# Altium integrated library MS-Electronic.IntLib: 363 symbols (part 2 of 2) (continued)
## Res_1K5_1206_1%_1/4W (continued)
RES 1.5K OHM 1% 1/4W 1206; ComponentLink2Description: CXT; ComponentLink2URL: https://linhkien.cxtvn.com/3351-dien-tro-1206-5-thong-so-tu-1k-den-91k.html; ComponentLink3Description: DIGIKEY; ComponentLink3URL: https://www.digikey.bg/en/products/detail/te-connectivity-passive-product/CRGCQ1206F1K5/8576414
footprint Res_1206
pins: 1, 2

## Res_1K_0402_1%_1/16W
designator R?, comment value 1K  Power: 1/16W  Tolerance: 1%  Pakage: 0402  (hidden comment: RC0402FR-071KL)
RES 1K OHM 1% 1/16W 0402; ComponentLink1Description: CXT; ComponentLink1URL: https://linhkien.cxtvn.com/3454-dien-tro-0402-1-thong-so-tu-1k-den-91k.html; ComponentLink2Description: DIGIKEY; ComponentLink2URL: https://www.digikey.bg/en/products/detail/yageo/RC0402FR-071KL/726513?s=N4IgTCBcDaIEoGEAMAWJYBicC0SDsAjANIAyIAugL5A
footprint RES_0402
pins: 1, 2

## Res_1K_0603_0.01%_1/10W
designator R?, comment value 1K  Power: 1/10W  Pakage: 0603  Tolerance: 0.01%  (hidden comment: RNCF0603TKY1K00)
RES SMD 1K OHM 0.01% 1/10W 0603; ComponentLink1Description: DIGIKEY; ComponentLink1URL: https://www.digikey.bg/en/products/detail/stackpole-electronics-inc/RNCF0603TKY1K00/2269697?s=N4IgTCBcDaIEoDkDCAxADANjQZgCoGkBNARnzTRAF0BfIA
footprint RESC1608X05N (Chip Resistor, 2-Leads, Body 1.60x0.80mm (0603))
pins: 1, 2

## Res_1K_0603_1%_1/10W
designator R?, comment value 1K  Power: 1/10W  Pakage: 0603  Tolerance: 1%  (hidden comment: RC0603FR-071KL)
RES 1K OHM 1% 1/10W 0603; ComponentLink1Description: New link; ComponentLink1URL: https://linhkien.cxtvn.com/1424-dien-tro-0603-1-thong-so-tu-1k-den-91k.html; ComponentLink2Description: New link 1; ComponentLink2URL: https://www.digikey.bg/en/products/detail/yageo/RC0603FR-071KL/726843
footprint RESC1608X05N (Chip Resistor, 2-Leads, Body 1.60x0.80mm (0603))
pins: 1, 2

## Res_1M_0402_1%_1/16W
designator R?, comment value 1M  Power: 1/16W  Tolerance: 1%  Pakage: 0402  (hidden comment: RC0402FR-071ML)
RES 1M OHM 1% 1/16W 0402; ComponentLink1Description: CXT; ComponentLink1URL: https://linhkien.cxtvn.com/2940-dien-tro-0402-1-thong-so-tu-1m-den-10m.html; ComponentLink2Description: DIGIKEY; ComponentLink2URL: https://www.digikey.bg/en/products/detail/yageo/RC0402FR-071ML/726515
footprint RES_0402
pins: 1, 2

## Res_1M_0603_1%_1/10W
designator R?, comment value 1M  Power: 1/10W  Pakage: 0603  Tolerance: 1%  (hidden comment: RC0603FR-071ML)
RES 1M OHM 1% 1/10W 0603; ComponentLink1Description: CXT; ComponentLink1URL: https://linhkien.cxtvn.com/2390-dien-tro-0603-1-thong-so-tu-1m-den-10m.html; ComponentLink2Description: DIGIKEY; ComponentLink2URL: https://www.digikey.com/en/products/detail/yageo/RC0603FR-071ML/726844
footprint RESC1608X05N (Chip Resistor, 2-Leads, Body 1.60x0.80mm (0603))
pins: 1, 2

## Res_1mR_3920_1%_8W
designator R?, comment value 1mR  Tolerance: 1%  Power: 8W  Package: 3920  (hidden comment: CSS2H-3920R-1L00FE)
RES 0.001 OHM 1% 8W 3920; ComponentLink2Description: DIGIKEY; ComponentLink2URL: https://www.digikey.com/en/products/detail/bourns-inc/CSS2H-3920R-1L00FE/6229290?s=N4IgTCBcDaIMIGUFgBIFoDMBOMAGASmgIwAyuuAZgKYgC6AvkA
footprint RES_3920
pins: 1, 2

## Res_2.2K_0603_1%_1/10W
designator R?, comment value 2.2K  Power: 1/10W  Pakage: 0603  Tolerance: 1%  (hidden comment: RMCF0603FT2K20)
RES 2.2K OHM 1% 1/10W 0603; ComponentLink1Description: CXT; ComponentLink1URL: https://linhkien.cxtvn.com/3649-dien-tro-0603-1-thong-so-tu-1k-den-91k.html; ComponentLink2Description: DIGIKEY; ComponentLink2URL: https://www.digikey.com/en/products/detail/stackpole-electronics-inc/RMCF0603FT2K20/1760987
footprint RESC1608X05N (Chip Resistor, 2-Leads, Body 1.60x0.80mm (0603))
pins: 1, 2

## Res_2K2_1206_1%_1/4W
designator R?, comment value 2K2  Power: 1/4W  Pakage: 1206  Tolerance: 1%  (hidden comment: RMCF1206FT2K20)
RES 2.2K OHM 1% 1/4W 1206; ComponentLink1Description: CXT; ComponentLink1URL: https://linhkien.cxtvn.com/4144-dien-tro-1206-1-thong-so-tu-1k-den-910k.html; ComponentLink2Description: DIGIKEY; ComponentLink2URL: https://www.digikey.bg/en/products/detail/stackpole-electronics-inc/RMCF1206FT2K20/1759713
footprint Res_1206
pins: 1, 2

## Res_2K_1206_1%_1/4W
designator R?, comment value 2K  Power: 1/4W  Pakage: 1206  Tolerance: 1%  (hidden comment: RMCF1206FT2K00)
RES 2K OHM 1% 1/4W 1206; ComponentLink1Description: CXT; ComponentLink1URL: https://linhkien.cxtvn.com/3352-dien-tro-1206-5-thong-so-tu-1k-den-91k.html; ComponentLink2Description: DIGIKEY; ComponentLink2URL: https://www.digikey.bg/en/products/detail/stackpole-electronics-inc/RMCF1206FT2K00/1759723
footprint Res_1206
pins: 1, 2

## Res_2mR_3920_1%_6W
designator R?, comment value 2mR  Tolerance: 1%  Power: 6W  Package: 3920  (hidden comment: CSS2H-3920K-2L00FE)
RES 0.002 OHM 1% 6W 3920; ComponentLink2Description: DIGIKEY; ComponentLink2URL: https://www.digikey.com/en/products/detail/bourns-inc/CSS2H-3920K-2L00FE/6229291?s=N4IgTCBcDaIMIGUFgBIFoDMBOMAGA0mmADK64BmApiALoC%2BQA
footprint RES_3920
pins: 1, 2

## Res_3.3R_0805_1%_1/8W
designator R?, comment value 3.3R  Tolerance: 1%  Power: 1/8W  Package: 0805  (hidden comment: ERJ-6RQF3R3V)
RES 3.3 OHM 1% 1/8W 0805; ComponentLink1Description: BLK; ComponentLink1URL: https://banlinhkien.com/tro-0805-1-3.3r-50c-p6650101.html; ComponentLink2Description: DIGIKEY; ComponentLink2URL: https://www.digikey.com/en/products/detail/panasonic-electronic-components/ERJ-6RQF3R3V/250178?s=N4IgTCBcDaIKICUBSBaAbAgigMQMwNwDUQBdAXyA
footprint Res_0805
pins: 1, 2

## Res_3K_0603_1%_1/10W
designator R?, comment value 3K  Power: 1/10W  Pakage: 0603  Tolerance: 1%  (hidden comment: RMCF0603FT3K00)
RES 3K OHM 1% 1/10W 0603; ComponentLink1Description: LKCL; ComponentLink1URL: https://linhkienchatluong.vn/dien-tro-dan-0603-116w-1/dien-tro-dan-0603-3k-1-50c_sp836_ct11748.aspx; ComponentLink2Description: DIGIKEY; ComponentLink2URL: https://www.digikey.bg/en/products/detail/stackpole-electronics-inc/RMCF0603FT3K00/1713988
footprint RESC1608X05N (Chip Resistor, 2-Leads, Body 1.60x0.80mm (0603))
pins: 1, 2

## Res_3K_TH_5%_1/2W
designator R?, comment ROX05SJ3K0
RES 3K OHM 5% 1/2W AXIAL; Manufacturer: TE Connectivity Passive Product; Part Number: ROX05SJ3K0; Value: 3K; Tolerance: 5%; Power: 1/2W; Dimension: 2.50mm x 7.50mm; ComponentLink1Description: New link; ComponentLink1URL: *; ComponentLink2Description: DIGIKEY; ComponentLink2URL: https://www.digikey.bg/en/products/detail/te-connectivity-passive-product/ROX05SJ3K0/9926141
footprint RES_TH_1/2W
pins: 1, 2

## Res_4.7K_0603_1%_1/10W
designator R?, comment value 4.7K  Power: 1/10W  Pakage: 0603  Tolerance: 1%  (hidden comment: RC0603FR-074K7L)
RES 4.7K OHM 1% 1/10W 0603; ComponentLink1Description: CXT; ComponentLink1URL: https://linhkien.cxtvn.com/2398-dien-tro-0603-1-thong-so-tu-1k-den-91k.html; ComponentLink2Description: DIGIKEY; ComponentLink2URL: https://www.digikey.com/en/products/detail/yageo/RC0603FR-074K7L/727212
footprint RESC1608X05N (Chip Resistor, 2-Leads, Body 1.60x0.80mm (0603))
pins: 1, 2

## Res_4.7R_0603_1%_1/16W
designator R?, comment value 4.7R  Power: 1/16W  Pakage: 0603  Tolerance: 1%  (hidden comment: RN73G1JTD4R70D)
RES SMD_4.7R_0.5%_1/16W, 0.625W; ComponentLink1Description: CXT; ComponentLink1URL: https://linhkien.cxtvn.com/2259-dien-tro-0603-1-thong-so-tu-0r-den-910r.html; ComponentLink2Description: DIGIKEY; ComponentLink2URL: https://www.digikey.com/en/products/detail/meritek/RN73G1JTD4R70D/16549473?s=N4IgTCBcDaIEoFEDKACALAOgOxxQBgDY8BmEAXQF8g
footprint RESC1608X05N (Chip Resistor, 2-Leads, Body 1.60x0.80mm (0603))
pins: 1, 2

## Res_4K7_0805_1%_1/8W
designator R?, comment value 4K7  Tolerance: 1%  Power: 1/8W  Package: 0805  (hidden comment: CRCW08054K70FKEAC)
RES 4.7K OHM 1% 1/8W 0805; ComponentLink1Description: CXT; ComponentLink1URL: https://linhkien.cxtvn.com/2349-dien-tro-0805-1-thong-so-tu-1k-den-91k.html; ComponentLink2Description: DIGIKEY; ComponentLink2URL: https://www.digikey.com/en/products/detail/vishay-dale/CRCW08054K70FKEAC/7928553
footprint Res_0805
pins: 1, 2

## Res_4mR_3920_1%_4W
designator R?, comment value 4mR  Tolerance: 1%  Power: 4W  Package: 3920  (hidden comment: CSS2H-3920K-4L00F)
CURRENTSENSESHUNT 3920 R004 1% 4; ComponentLink2Description: DIGIKEY
footprint RES_3920
pins: 1, 2

## Res_5.1K_0603_1%_1/10W
designator R?, comment value 5.1K  Power: 1/10W  Pakage: 0603  Tolerance: 1%  (hidden comment: RMCF0603FT5K10)
RES 5.1K OHM 1% 1/10W 0603; ComponentLink1Description: CXT; ComponentLink1URL: https://linhkien.cxtvn.com/2291-dien-tro-0603-1-thong-so-tu-1k-den-91k.html; ComponentLink2Description: DIGIKEY; ComponentLink2URL: https://www.digikey.bg/en/products/detail/stackpole-electronics-inc/RMCF0603FT5K10/1760908?s=N4IgTCBcDaIEoFkDCAxADANjQZhQFQFYBpARjRAF0BfIA
footprint RESC1608X05N (Chip Resistor, 2-Leads, Body 1.60x0.80mm (0603))
pins: 1, 2

## Res_5.1R_2512_5%_1.5W
designator R?, comment value 5.1R  Tolerance: 5%  Power: 1.5W  Package: 2512  (hidden comment: CRCW25125R10JNEHHP)
RES SMD 5.1 OHM 5% 1.5W 2512; ComponentLink1Description: LKCL; ComponentLink1URL: https://linhkienchatluong.vn/dien-tro-dan-2512-1w/dien-tro-dan-2512-51r-1w-5-10c_sp839_ct6156.aspx; ComponentLink2Description: DIGIKEY; ComponentLink2URL: https://www.digikey.bg/en/products/detail/vishay-dale/CRCW25125R10JNEHHP/5079493
footprint Res_2512_3W_CRE2512-FZ-R003E-3
pins: 1, 2

## Res_6.8K_0603_1%_1/10W
designator R?, comment value 6.8K  Power: 1/10W  Pakage: 0603  Tolerance: 1%  (hidden comment: RC0603FR-106K8L)
RES 6.8K OHM 1% 1/10W 0603; ComponentLink1Description: CXT; ComponentLink1URL: https://linhkien.cxtvn.com/5034-dien-tro-0603-1-thong-so-tu-1k-den-91k.html; ComponentLink2Description: DIGIKEY; ComponentLink2URL: https://www.digikey.bg/en/products/detail/yageo/RC0603FR-106K8L/14008237
footprint RESC1608X05N (Chip Resistor, 2-Leads, Body 1.60x0.80mm (0603))
pins: 1, 2

## Res_10.2K_0603_1%_1/10W
designator R?, comment value 10.2K  Power: 1/10W  Package: 0603  Tolerance: 1%  (hidden comment: RC0603FR-1310K2L)
RES 10.2K OHM 1% 1/10W 0603; ComponentLink1Description: CXT; ComponentLink1URL: https://linhkien.cxtvn.com/4622-dien-tro-0603-1-thong-so-tu-1k-den-91k.html; ComponentLink2Description: DIGIKEY; ComponentLink2URL: https://www.digikey.bg/en/products/detail/yageo/RC0603FR-07560RL/727304
footprint RESC1608X05N (Chip Resistor, 2-Leads, Body 1.60x0.80mm (0603))
pins: 1, 2

## Res_10K_0402_5%_1/16W
designator R?, comment value 10K  Power: 1/16W  Tolerance: 5%  Pakage: 0402  (hidden comment: RC0402JR-0710KL)
RES 10K OHM 5% 1/16W 0402; ComponentLink1Description: CXT; ComponentLink1URL: https://linhkien.cxtvn.com/2824-dien-tro-10k-0402-5-50c.html; ComponentLink2Description: DIGIKEY; ComponentLink2URL: https://www.digikey.com/en/products/detail/yageo/RC0402JR-0710KL/726418
footprint RES_0402
pins: 1, 2

## Res_10K_0603_1%_1/10W
designator R?, comment value 10K  Power: 1/10W  Package: 0603  Tolerance: 1%  (hidden comment: RC0603FR-0710KL)
RES 10K OHM 1% 1/10W 0603; ComponentLink1Description: CXT; ComponentLink1URL: https://linhkien.cxtvn.com/1422-dien-tro-0603-1-thong-so-tu-1k-den-91k.html; ComponentLink2Description: DIGIKEY; ComponentLink2URL: https://www.digikey.com/en/products/detail/yageo/RC0603FR-0710KL/726880?s=N4IgTCBcDaIEoGEAMA2JBmAYnAtEg7AIxIDSAMiALoC%2BQA
footprint RESC1608X05N (Chip Resistor, 2-Leads, Body 1.60x0.80mm (0603))
pins: 1, 2

## Res_10K_1206_1%_1/4W
designator R?, comment value 10K  Power: 1/4W  Pakage: 1206  Tolerance: 1%  (hidden comment: RC1206FR-0710KL)
RES 10K OHM 1% 1/4W 1206; ComponentLink1Description: CXT; ComponentLink1URL: https://linhkien.cxtvn.com/2656-dien-tro-1206-1-thong-so-tu-1k-den-910k.html; ComponentLink2Description: DIGIKEY; ComponentLink2URL: https://www.digikey.bg/en/products/detail/yageo/RC1206FR-0710KL/728483
footprint Res_1206
pins: 1, 2

## Res_10M_0603_1%_1/10W
designator R?, comment value 10M  Power: 1/10W  Pakage: 0603  Tolerance: 1%  (hidden comment: WR06W1005FTL)
RES 10M OHM 1% 1/10W 0603; ComponentLink1Description: LKCL; ComponentLink1URL: https://linhkienchatluong.vn/dien-tro-dan-0603-116w-1/dien-tro-dan-0603-10m-1-01f-50c_sp836_ct8446.aspx; ComponentLink2Description: DIGIKEY; ComponentLink2URL: https://www.digikey.bg/en/products/detail/walsin-technology-corporation/WR06W1005FTL/13243162?s=N4IgTCBcDaIOoCUAMA2OBGJSCsAxAKgDIgC6AvkA
footprint RESC1608X05N (Chip Resistor, 2-Leads, Body 1.60x0.80mm (0603))
pins: 1, 2

## Res_10R_0603_1%_1/10W
designator R?, comment value 10R  Power: 1/10W  Pakage: 0603  Tolerance: 1%  (hidden comment: RMCF0603FT10R0)
RES 10 OHM 1% 1/10W 0603; ComponentLink1Description: CXT; ComponentLink1URL: https://linhkien.cxtvn.com/2391-dien-tro-0603-1-thong-so-tu-0r-den-910r.html; ComponentLink2Description: DIGIKEY; ComponentLink2URL: https://www.digikey.com/en/products/detail/stackpole-electronics-inc/RMCF0603FT10R0/1761152
footprint RESC1608X05N (Chip Resistor, 2-Leads, Body 1.60x0.80mm (0603))
pins: 1, 2

## Res_12.1K_0603_1%_1/10W
designator R?, comment value 12.1K  Power: 1/10W  Package: 0603  Tolerance: 1%  (hidden comment: 0603WAF1212T5E)
RES 12.1K OHM 1% 1/10W 0603; ComponentLink1Description: CXT; ComponentLink1URL: https://linhkien.cxtvn.com/7742-dien-tro-0603-1-thong-so-tu-1k-den-91k.html; ComponentLink2Description: MOUSER; ComponentLink2URL: https://www.mouser.vn/ProductDetail/Royalohm/0603WAF1212T5E?qs=e8oIoAS2J1QOf5tSbOLY6A%3D%3D
footprint RESC1608X05N (Chip Resistor, 2-Leads, Body 1.60x0.80mm (0603))
pins: 1, 2

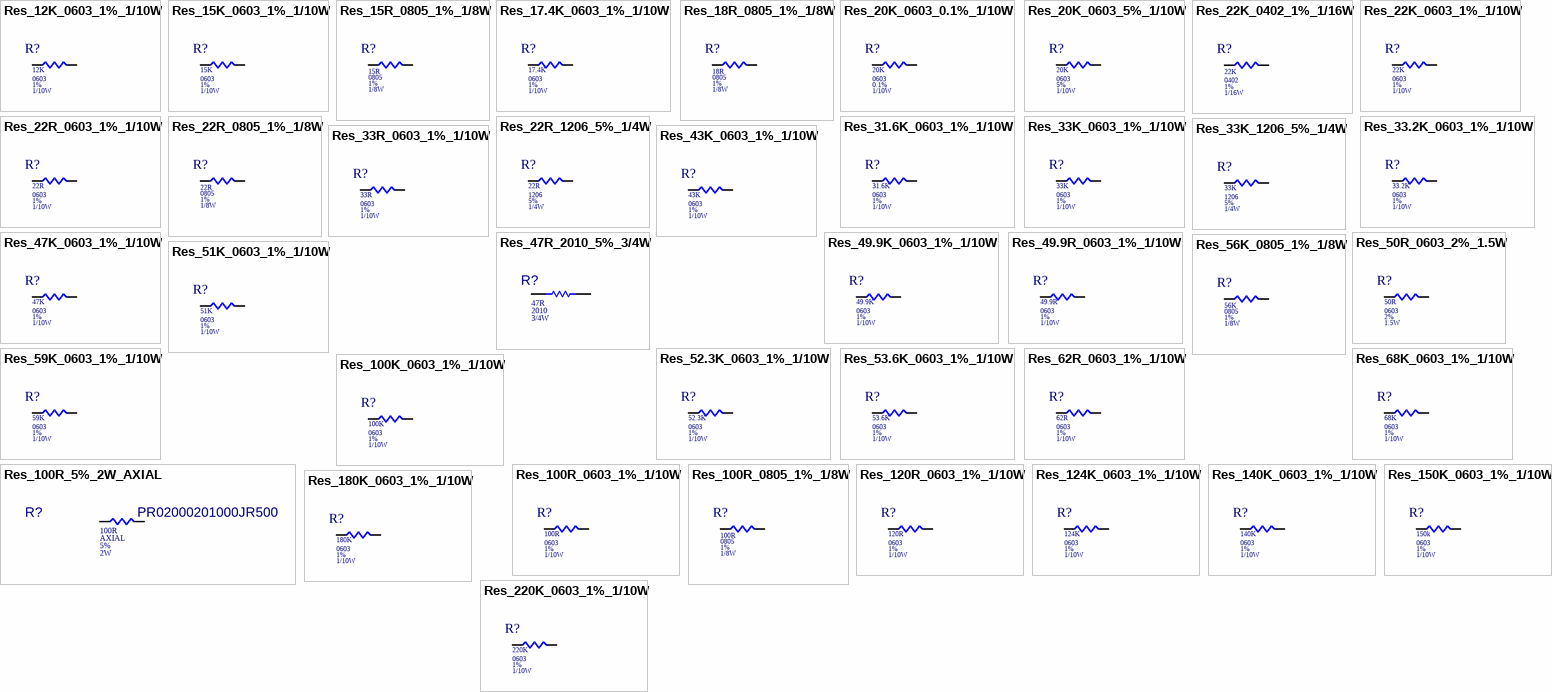
[diagram p9: symbols Res_12K_0603_1%_1/10W to Res_220K_0603_1%_1/10W]

## Res_12K_0603_1%_1/10W
designator R?, comment value 12K  Power: 1/10W  Package: 0603  Tolerance: 1%  (hidden comment: RMCF0603FT12K0)
RES 12K OHM 1% 1/10W 0603; ComponentLink1Description: CXT; ComponentLink1URL: https://linhkien.cxtvn.com/4536-dien-tro-0603-1-thong-so-tu-1k-den-91k.html; ComponentLink2Description: DIGIKEY; ComponentLink2URL: https://www.digikey.com/en/products/detail/stackpole-electronics-inc/RMCF0603FT12K0/1761297
footprint RESC1608X05N (Chip Resistor, 2-Leads, Body 1.60x0.80mm (0603))
pins: 1, 2

## Res_15K_0603_1%_1/10W
designator R?, comment value 15K  Power: 1/10W  Pakage: 0603  Tolerance: 1%  (hidden comment: RMCF0603FT15K0)
RES 15K OHM 1% 1/10W 0603; ComponentLink1Description: CXT; ComponentLink1URL: https://linhkien.cxtvn.com/7715-dien-tro-0603-1-thong-so-tu-1k-den-91k.html; ComponentLink2Description: DIGIKEY; ComponentLink2URL: https://www.digikey.bg/en/products/detail/stackpole-electronics-inc/RMCF0603FT15K0/1760774
footprint RESC1608X05N (Chip Resistor, 2-Leads, Body 1.60x0.80mm (0603))
pins: 1, 2

## Res_15R_0805_1%_1/8W
designator R?, comment value 15R  Tolerance: 1%  Power: 1/8W  Package: 0805  (hidden comment: RC0805FR-0715RL)
RES 15 OHM 1% 1/8W 0805; ComponentLink1Description: LKCL; ComponentLink1URL: https://linhkien.cxtvn.com/11196-dien-tro-0805-1-thong-so-tu-0r-den-910r.html; ComponentLink2Description: DIGIKEY; ComponentLink2URL: https://www.digikey.bg/en/products/detail/yageo/RC0805FR-0715RL/727607?s=N4IgTCBcDaIEoGEAMAOJBWAYnAtEg7AIzpwAyIAugL5A
footprint Res_0805
pins: 1, 2

## Res_17.4K_0603_1%_1/10W
designator R?, comment value 17.4K  Power: 1/10W  Package: 0603  Tolerance: 1%  (hidden comment: ERJ-3EKF1742V)
RES SMD 17.4K OHM 1% 1/10W 0603; ComponentLink1Description: CXT; ComponentLink1URL: https://linhkien.cxtvn.com/7311-dien-tro-0603-1-thong-so-tu-1k-den-91k.html; ComponentLink2Description: DIGIKEY; ComponentLink2URL: https://www.digikey.com/en/products/detail/panasonic-electronic-components/ERJ-3EKF1742V/196159
footprint RESC1608X05N (Chip Resistor, 2-Leads, Body 1.60x0.80mm (0603))
pins: 1, 2

## Res_18R_0805_1%_1/8W
designator R?, comment value 18R  Tolerance: 1%  Power: 1/8W  Package: 0805  (hidden comment: RC0805FR-0718RL)
RES 18 OHM 1% 1/8W 0805; ComponentLink1Description: LKCL; ComponentLink1URL: https://linhkienchatluong.vn/dien-tro-dan-0805-110w-1/dien-tro-dan-0805-18r-1-50c_sp837_ct5301.aspx; ComponentLink2Description: DIGIKEY; ComponentLink2URL: https://www.digikey.bg/en/products/detail/yageo/RC0805FR-0718RL/727643?s=N4IgTCBcDaIEoGEAMAOJBWAYnAtEg7AIwpwAyIAugL5A
footprint Res_0805
pins: 1, 2

## Res_20K_0603_0.1%_1/10W
designator R?, comment value 20K  Power: 1/10W  Pakage: 0603  Tolerance: 0.1%  (hidden comment: RT0603BRD0720KL)
RES SMD 20K OHM 0.1% 1/10W 0603; ComponentLink1Description: DIGIKEY; ComponentLink1URL: https://www.digikey.bg/en/products/detail/yageo/RT0603BRD0720KL/1072350?s=N4IgTCBcDaIEoBUAMA2JBmAQnAIkg7GEgNIAyIAugL5A
footprint RESC1608X05N (Chip Resistor, 2-Leads, Body 1.60x0.80mm (0603))
pins: 1, 2

## Res_20K_0603_5%_1/10W
designator R?, comment value 20K  Power: 1/10W  Package: 0603  Tolerance: 5%  (hidden comment: CRCW060320K0JNEAC)
RES 20K OHM 5% 1/10W 0603; ComponentLink2Description: CXT; ComponentLink2URL: https://linhkien.cxtvn.com/5973-dien-tro-0603-1-thong-so-tu-1k-den-91k.html; ComponentLink3Description: DIGIKEY; ComponentLink3URL: https://www.digikey.bg/en/products/detail/vishay-dale/CRCW060320K0JNEAC/7925426?s=N4IgTCBcDaIMICU4HUAMA2VBmMqDSqAUgHICiAgnCALoC%2BQA
footprint RESC1608X05N (Chip Resistor, 2-Leads, Body 1.60x0.80mm (0603))
pins: 1, 2

## Res_22K_0402_1%_1/16W
designator R?, comment value 22K  Power: 1/16W  Tolerance: 1%  Pakage: 0402  (hidden comment: RC0402FR-0722KL)
RES 22K OHM 1% 1/16W 0402; ComponentLink1Description: CXT; ComponentLink1URL: https://linhkien.cxtvn.com/7738-dien-tro-0402-1-thong-so-tu-1k-den-91k.html; ComponentLink2Description: DIGIKEY; ComponentLink2URL: https://www.digikey.bg/en/products/detail/yageo/RC0402FR-0722KL/726561?s=N4IgTCBcDaIEoGEAMAWJYBicC0SDsYYA0gDIgC6AvkA
footprint RES_0402
pins: 1, 2

## Res_22K_0603_1%_1/10W
designator R?, comment value 22K  Power: 1/10W  Package: 0603  Tolerance: 1%  (hidden comment: RK73H1JTTD2202F)
RES 22K OHM 1% 1/10W 0603; ComponentLink2Description: CXT; ComponentLink2URL: https://linhkien.cxtvn.com/3650-dien-tro-0603-1-thong-so-tu-1k-den-91k.html; ComponentLink3Description: DIGIKEY; ComponentLink3URL: https://www.digikey.bg/en/products/detail/koa-speer-electronics-inc/RK73H1JTTD2202F/9844886
footprint RESC1608X05N (Chip Resistor, 2-Leads, Body 1.60x0.80mm (0603))
pins: 1, 2

## Res_22R_0603_1%_1/10W
designator R?, comment value 22R  Power: 1/10W  Pakage: 0603  Tolerance: 1%  (hidden comment: RMCF0603FT22R0)
RES 22 OHM 1% 1/10W 0603; ComponentLink1Description: CXT; ComponentLink1URL: https://linhkien.cxtvn.com/4435-dien-tro-0603-1-thong-so-tu-0r-den-910r.html; ComponentLink2Description: DIGIKEY; ComponentLink2URL: https://www.digikey.bg/en/products/detail/stackpole-electronics-inc/RMCF0603FT22R0/1760726
footprint RESC1608X05N (Chip Resistor, 2-Leads, Body 1.60x0.80mm (0603))
pins: 1, 2

## Res_22R_0805_1%_1/8W
designator R?, comment value 22R  Tolerance: 1%  Power: 1/8W  Package: 0805  (hidden comment: RMCF0805FT22R0)
RES 22 OHM 1% 1/8W 0805; ComponentLink1Description: BLK; ComponentLink1URL: https://banlinhkien.com/tro-0805-1-22r-50c-p20821304.html; ComponentLink2Description: DIGIKEY; ComponentLink2URL: https://www.digikey.com/en/products/detail/stackpole-electronics-inc/RMCF0805FT22R0/1712862
footprint Res_0805
pins: 1, 2

## Res_22R_1206_5%_1/4W
designator R?, comment value 22R  Power: 1/4W  Pakage: 1206  Tolerance: 5%  (hidden comment: RC1206JR-0722RL)
RES 22 OHM 5% 1/4W 1206; ComponentLink1Description: CXT; ComponentLink1URL: https://linhkien.cxtvn.com/4214-dien-tro-1206-1-thong-so-tu-0r-den-910r.html; ComponentLink2Description: DIGIKEY; ComponentLink2URL: https://www.digikey.bg/en/products/detail/yageo/RC1206JR-0722RL/729253
footprint Res_1206
pins: 1, 2

## Res_31.6K_0603_1%_1/10W
designator R?, comment value 31.6K  Power: 1/10W  Package: 0603  Tolerance: 1%  (hidden comment: RMCF0603FT31K6)
RES 31.6K OHM 1% 1/10W 0603; ComponentLink1Description: CXT; ComponentLink1URL: https://linhkien.cxtvn.com/6107-dien-tro-0603-1-thong-so-tu-1k-den-91k.html; ComponentLink2Description: DIGIKEY; ComponentLink2URL: https://www.digikey.bg/en/products/detail/yageo/RC0603FR-07560RL/727304
footprint RESC1608X05N (Chip Resistor, 2-Leads, Body 1.60x0.80mm (0603))
pins: 1, 2

## Res_33.2K_0603_1%_1/10W
designator R?, comment value 33.2K  Power: 1/10W  Pakage: 0603  Tolerance: 1%  (hidden comment: RC0603FR-1333K2L)
RES 33.2K OHM 1% 1/10W 0603; ComponentLink1Description: CXT; ComponentLink1URL: https://linhkien.cxtvn.com/4794-dien-tro-0603-1-thong-so-tu-1k-den-91k.html; ComponentLink2Description: DIGIKEY; ComponentLink2URL: https://www.digikey.bg/en/products/detail/yageo/RC0603FR-1333K2L/14286664
footprint RESC1608X05N (Chip Resistor, 2-Leads, Body 1.60x0.80mm (0603))
pins: 1, 2

## Res_33K_0603_1%_1/10W
designator R?, comment value 33K  Power: 1/10W  Package: 0603  Tolerance: 1%  (hidden comment: RC0603FR-0733KL)
RES 33K OHM 1% 1/10W 0603; ComponentLink1Description: CXT; ComponentLink1URL: https://linhkien.cxtvn.com/8763-dien-tro-0603-1-thong-so-tu-1k-den-91k.html; ComponentLink2Description: DIGIKEY; ComponentLink2URL: https://www.digikey.com/en/products/detail/yageo/RC0603FR-0733KL/727159
footprint RESC1608X05N (Chip Resistor, 2-Leads, Body 1.60x0.80mm (0603))
pins: 1, 2

## Res_33K_1206_5%_1/4W
designator R?, comment value 33K  Power: 1/4W  Pakage: 1206  Tolerance: 5%  (hidden comment: RC1206JR-0733KL)
RES 33K OHM 5% 1/4W 1206; ComponentLink1Description: BLK; ComponentLink1URL: https://banlinhkien.com/tro-1206-5-33k-50c-p6650177.html; ComponentLink2Description: DIGIKEY; ComponentLink2URL: https://www.digikey.bg/en/products/detail/yageo/RC1206JR-0733KL/729282
footprint Res_1206
pins: 1, 2

## Res_33R_0603_1%_1/10W
designator R?, comment value 33R  Power: 1/10W  Package: 0603  Tolerance: 1%  (hidden comment: 0603WAF330JT5E)
RES 33 OHM 1% 1/10W 0603; ComponentLink1Description: CXT; ComponentLink1URL: https://linhkien.cxtvn.com/5969-dien-tro-0603-1-thong-so-tu-0r-den-910r.html; ComponentLink2Description: DIGIKEY; ComponentLink2URL: https://www.mouser.vn/ProductDetail/Royalohm/0603WAF330JT5E?qs=e8oIoAS2J1RitKiKgULsBA%3D%3D
footprint RESC1608X05N (Chip Resistor, 2-Leads, Body 1.60x0.80mm (0603))
pins: 1, 2

## Res_43K_0603_1%_1/10W
designator R?, comment value 43K  Power: 1/10W  Pakage: 0603  Tolerance: 1%  (hidden comment: RC0603FR-0743KL)
RES 43K OHM 1% 1/10W 0603; ComponentLink1Description: CXT; ComponentLink1URL: https://linhkien.cxtvn.com/11304-dien-tro-0603-1-thong-so-tu-1k-den-91k.html; ComponentLink2Description: DIGIKEY; ComponentLink2URL: https://www.digikey.com/en/products/detail/yageo/RC0603FR-0743KL/727233
footprint RESC1608X05N (Chip Resistor, 2-Leads, Body 1.60x0.80mm (0603))
pins: 1, 2

## Res_47K_0603_1%_1/10W
designator R?, comment value 47K  Power: 1/10W  Pakage: 0603  Tolerance: 1%  (hidden comment: RC0603FR-0747KL)
RES 47K OHM 1% 1/10W 0603; ComponentLink1Description: CXT; ComponentLink1URL: https://linhkien.cxtvn.com/4437-dien-tro-0603-1-thong-so-tu-1k-den-91k.html; ComponentLink2Description: DIGIKEY; ComponentLink2URL: https://www.digikey.com/en/products/detail/yageo/RC0603FR-0747KL/727253
footprint RESC1608X05N (Chip Resistor, 2-Leads, Body 1.60x0.80mm (0603))
pins: 1, 2

## Res_47R_2010_5%_3/4W
designator R?, comment Parameter 3: 3/4W  Parameter 2: 2010  Parameter 1: 47R  (hidden comment: MR20X470 JTL)
RES SMD 47 OHM 5% 3/4W 2010; Manufacturer: Panasonic Electronic Components; Part Code: S1100-000178; Description SEL: RES 47 OHM 5% 3/4W 2010; Point: 2; Value: 47Ohm; Part Number: MR20X470 JTL; Footprint Type: SMD
footprint RESC5025X70N
pins: 1, 2

## Res_49.9K_0603_1%_1/10W
designator R?, comment value 49.9K  Power: 1/10W  Package: 0603  Tolerance: 1%  (hidden comment: RMCF0603FT49K9)
RES 49.9K OHM 1% 1/10W 0603; ComponentLink1Description: CXT; ComponentLink1URL: https://linhkien.cxtvn.com/4499-dien-tro-0603-1-thong-so-tu-1k-den-91k.html; ComponentLink2Description: DIGIKEY; ComponentLink2URL: https://www.digikey.com/en/products/detail/stackpole-electronics-inc/RMCF0603FT49K9/1760907
footprint RESC1608X05N (Chip Resistor, 2-Leads, Body 1.60x0.80mm (0603))
pins: 1, 2

## Res_49.9R_0603_1%_1/10W
designator R?, comment value 49.9R  Power: 1/10W  Package: 0603  Tolerance: 1%  (hidden comment: RC0603FR-0749R9L)
RES 49.9 OHM 1% 1/10W 0603; ComponentLink1Description: CXT; ComponentLink1URL: https://linhkien.cxtvn.com/2395-dien-tro-0603-1-thong-so-tu-0r-den-910r.html; ComponentLink2Description: DIGIKEY; ComponentLink2URL: https://www.digikey.com/en/products/detail/yageo/RC0603FR-0749R9L/727264
footprint RESC1608X05N (Chip Resistor, 2-Leads, Body 1.60x0.80mm (0603))
pins: 1, 2

## Res_50R_0603_2%_1.5W
designator R?, comment value 50R  Power: 1.5W  Pakage: 0603  Tolerance: 2%  (hidden comment: RCP0603W50R0GEB)
RES SMD 50 OHM 2% 1.5W 0603; ComponentLink1Description: TGIC; ComponentLink1URL: https://www.thegioiic.com/dien-tro-50-ohm-0603-5-; ComponentLink2Description: DIGIKEY; ComponentLink2URL: https://www.digikey.com/en/products/detail/vishay-dale/RCP0603W50R0GEB/5481869
footprint RESC1608X05N (Chip Resistor, 2-Leads, Body 1.60x0.80mm (0603))
pins: 1, 2

## Res_51K_0603_1%_1/10W
designator R?, comment value 51K  Power: 1/10W  Package: 0603  Tolerance: 1%  (hidden comment: RC0603FR-0751KL)
RES 51K OHM 1% 1/10W 0603; ComponentLink2Description: CXT; ComponentLink2URL: https://linhkien.cxtvn.com/7715-dien-tro-0603-1-thong-so-tu-1k-den-91k.html; ComponentLink3Description: DIGIKEY; ComponentLink3URL: https://www.digikey.bg/en/products/detail/yageo/RC0603FR-0751KL/727282
footprint RESC1608X05N (Chip Resistor, 2-Leads, Body 1.60x0.80mm (0603))
pins: 1, 2

## Res_52.3K_0603_1%_1/10W
designator R?, comment value 52.3K  Power: 1/10W  Package: 0603  Tolerance: 1%  (hidden comment: RMCF0603FT52K3)
RES 52.3K OHM 1% 1/10W 0603; ComponentLink1Description: CXT; ComponentLink1URL: https://linhkien.cxtvn.com/4828-dien-tro-0603-1-thong-so-tu-1k-den-91k.html; ComponentLink2Description: DIGIKEY; ComponentLink2URL: https://www.digikey.com/en/products/detail/stackpole-electronics-inc/RMCF0603FT52K3/1714113
footprint RESC1608X05N (Chip Resistor, 2-Leads, Body 1.60x0.80mm (0603))
pins: 1, 2

## Res_53.6K_0603_1%_1/10W
designator R?, comment value 53.6K  Power: 1/10W  Package: 0603  Tolerance: 1%  (hidden comment: RMCF0603FT53K6)
RES 53.6K OHM 1% 1/10W 0603; ComponentLink2Description: New link 1; ComponentLink2URL: https://www.digikey.com/en/products/detail/stackpole-electronics-inc/RMCF0603FT53K6/1760885
footprint RESC1608X05N (Chip Resistor, 2-Leads, Body 1.60x0.80mm (0603))
pins: 1, 2

## Res_56K_0805_1%_1/8W
designator R?, comment value 56K  Tolerance: 1%  Power: 1/8W  Package: 0805  (hidden comment: CRCW080556K0FKEA)
RES SMD 56K OHM 1% 1/8W 0805; ComponentLink1Description: CXT; ComponentLink1URL: https://linhkien.cxtvn.com/5956-dien-tro-0805-1-thong-so-tu-1k-den-91k.html; ComponentLink2Description: DIGIKEY; ComponentLink2URL: https://www.digikey.bg/en/products/detail/vishay-dale/CRCW080556K0FKEA/1175836
footprint Res_0805
pins: 1, 2

## Res_59K_0603_1%_1/10W
designator R?, comment value 59K  Power: 1/10W  Package: 0603  Tolerance: 1%  (hidden comment: RMCF0603FT59K0)
RES 59K OHM 1% 1/10W 0603; ComponentLink2Description: CXT; ComponentLink2URL: https://linhkien.cxtvn.com/6097-dien-tro-0603-1-thong-so-tu-1k-den-91k.html; ComponentLink3Description: DIGIKEY; ComponentLink3URL: https://www.digikey.com/en/products/detail/stackpole-electronics-inc/RMCF0603FT59K0/1760782
footprint RESC1608X05N (Chip Resistor, 2-Leads, Body 1.60x0.80mm (0603))
pins: 1, 2

## Res_62R_0603_1%_1/10W
designator R?, comment value 62R  Power: 1/10W  Pakage: 0603  Tolerance: 1%  (hidden comment: RMCF0603FT62R0)